# Altium footprint library Vowstar_IC_General.PcbLib: 139 footprints (part 5 of 9)
Each footprint in its own frame and in the unit in brackets; x right, y up, seen from the top. Pads: shape width x height; smd on the part's side, far side on the other; paste and mask are expansions set on the pad; w line width, h text height; cw(c..) or ccw(c..) is an arc to the next point about the centre after c.
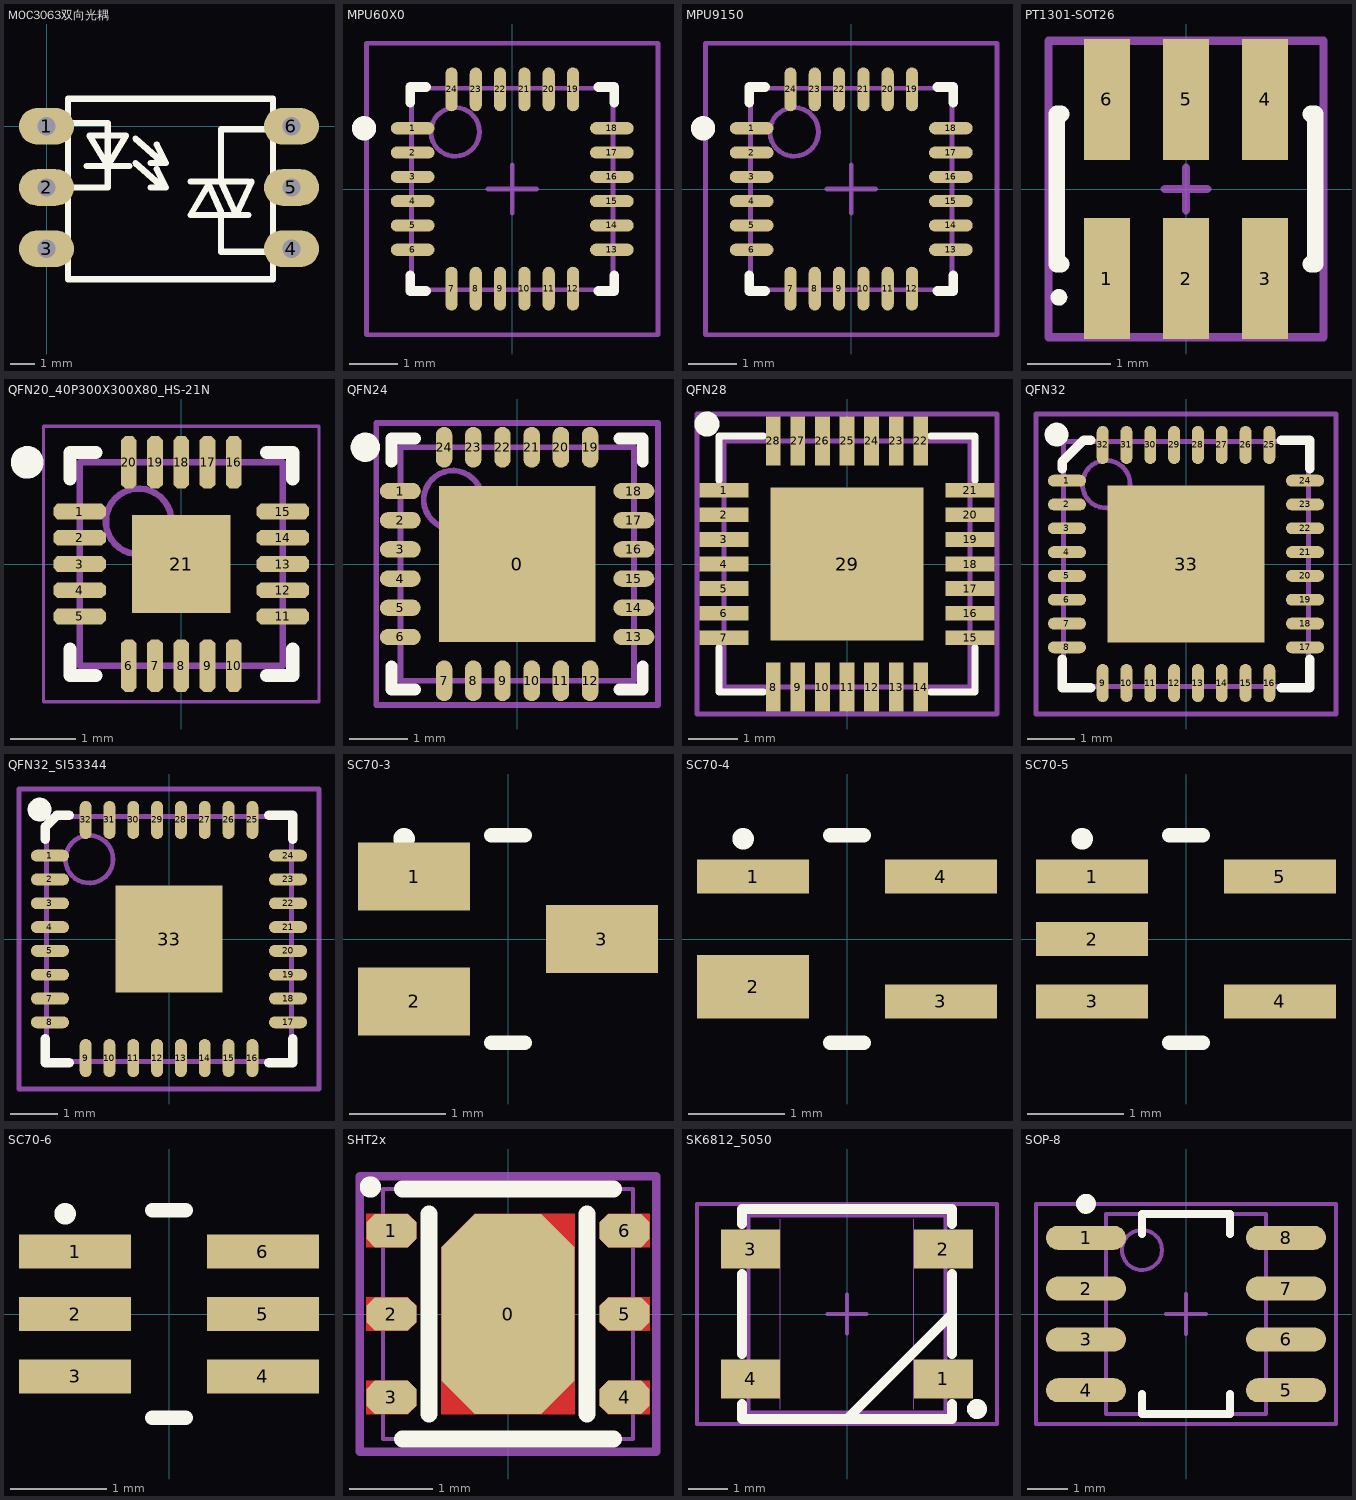
[diagram p4: the footprints below, top view; thin cyan lines are the x and y axes]

## MOC3063双向光耦 [mil] "MOC3063双向光耦"
pads (6):
  oval 90x60 hole 30: 1(0,0) 2(0,-100) 3(0,-200) 4(400,-200) 5(400,-100) 6(400,0)
Top Overlay:
  lines w10: 0,-100 100,-100 100,5 35,5 ; 65,-65 135,-65 ; 145,-60 185,-95 ; 145,-20 185,-55 ; 170,-100 195,-100 180,-70 ; 170,-60 195,-60 180,-30 ; 235,-90 330,-90 ; 285,-145 285,-205 370,-205 ; 285,-140 265,-95 235,-145 330,-145 ; 335,-90 310,-145 285,-90 285,-5 370,-5 ; 35,-250 35,45 370,45 370,-250 35,-250 ; 70,-15 100,-65 130,-15 70,-15

## MPU60X0 [mm] "24 Lead QFN (4x4x0.9) mm NiPdAu Lead-frame finish"
height 0.9
pads (24):
  oval 0.9x0.25 smd: 1(-2.05,1.25) 2(-2.05,0.75) 3(-2.05,0.25) 4(-2.05,-0.25) 5(-2.05,-0.75) 6(-2.05,-1.25) 13(2.05,-1.25) 14(2.05,-0.75) 15(2.05,-0.25) 16(2.05,0.25) 17(2.05,0.75) 18(2.05,1.25)
  oval 0.25x0.9 smd: 7(-1.25,-2.05) 8(-0.75,-2.05) 9(-0.25,-2.05) 10(0.25,-2.05) 11(0.75,-2.05) 12(1.25,-2.05) 19(1.25,2.05) 20(0.75,2.05) 21(0.25,2.05) 22(-0.25,2.05) 23(-0.75,2.05) 24(-1.25,2.05)
Top Overlay:
  circle w0.25: c-3.05,1.25 r0.125
  lines w0.2: -2.1,-1.775 -2.1,-2.1 -1.775,-2.1 ; -2.1,1.775 -2.1,2.1 -1.775,2.1 ; 1.775,-2.1 2.1,-2.1 2.1,-1.775 ; 1.775,2.1 2.1,2.1 2.1,1.775
Mechanical 13:
  circle w0.1: c-1.175,1.175 r0.5
  lines w0.1: -2.075,-2.075 -2.075,2.075 2.075,2.075 2.075,-2.075 -2.075,-2.075
Mechanical 15:
  lines w0.1: -0.5,0 0.5,0 ; 0,-0.5 0,0.5 ; -3,-3 -3,3 3,3 3,-3 -3,-3
3D body "User Library-QFN-24-4x4mm 0.5 Pitch.step": height 0.9, standoff 0, extent -2.002,-2.002 2.002,2.002

## MPU9150 [mm] "24 Lead QFN (4x4x0.9) mm NiPdAu Lead-frame finish"
height 0.9
pads (24):
  oval 0.9x0.25 smd: 1(-2.05,1.25) 2(-2.05,0.75) 3(-2.05,0.25) 4(-2.05,-0.25) 5(-2.05,-0.75) 6(-2.05,-1.25) 13(2.05,-1.25) 14(2.05,-0.75) 15(2.05,-0.25) 16(2.05,0.25) 17(2.05,0.75) 18(2.05,1.25)
  oval 0.25x0.9 smd: 7(-1.25,-2.05) 8(-0.75,-2.05) 9(-0.25,-2.05) 10(0.25,-2.05) 11(0.75,-2.05) 12(1.25,-2.05) 19(1.25,2.05) 20(0.75,2.05) 21(0.25,2.05) 22(-0.25,2.05) 23(-0.75,2.05) 24(-1.25,2.05)
Top Overlay:
  circle w0.25: c-3.05,1.25 r0.125
  lines w0.2: -2.1,-1.775 -2.1,-2.1 -1.775,-2.1 ; -2.1,1.775 -2.1,2.1 -1.775,2.1 ; 1.775,-2.1 2.1,-2.1 2.1,-1.775 ; 1.775,2.1 2.1,2.1 2.1,1.775
Mechanical 13:
  circle w0.1: c-1.175,1.175 r0.5
  lines w0.1: -2.075,-2.075 2.075,-2.075 2.075,2.075 -2.075,2.075 -2.075,-2.075
Mechanical 15:
  lines w0.1: -0.5,0 0.5,0 ; 0,-0.5 0,0.5 ; -3,-3 3,-3 3,3 -3,3 -3,-3
3D body "User Library-QFN-24-4x4mm 0.5 Pitch.step": height 0.9, standoff 0, extent -2.002,-2.002 2.002,2.002

## PT1301-SOT26 [mm] "PT1301-SOT26(SOT-23-6)"
height 1.45
pads (6):
  rect 0.55x1.45 smd: 1(-0.95,-1.075) 2(0,-1.075) 3(0.95,-1.075) 4(0.95,1.075) 5(0,1.075) 6(-0.95,1.075)
Top Overlay:
  circle w0.1: c-1.525,-1.3 r0.05
  lines w0.2: -1.5,-0.9 -1.55,-0.9 -1.55,0.9 -1.5,0.9 ; 1.5,-0.9 1.55,-0.9 1.55,0.9 1.5,0.9
Mechanical 15:
  lines w0.1: -0.254,0 0.254,0 ; 0,-0.254 0,0.254 ; -1.651,-1.778 -1.651,1.778 1.651,1.778 1.651,-1.778 -1.651,-1.778
3D body "User Library-SOT23-6.step": height 1.45, standoff 0, extent -1.448,-1.4 1.452,1.4

## QFN20_40P300X300X80_HS-21N [mm] "QFN, 20-Leads, Body 3.00x3.00mm, Pitch 0.40mm, Thermal Pad 1.65x1.65mm, IPC Medium Density"
height 0.8
pads (21):
  oct 0.8x0.24 smd: 1(-1.55,0.8) 2(-1.55,0.4) 3(-1.55,0) 4(-1.55,-0.4) 5(-1.55,-0.8) 11(1.55,-0.8) 12(1.55,-0.4) 13(1.55,0) 14(1.55,0.4) 15(1.55,0.8)
  oct 0.24x0.8 smd: 6(-0.8,-1.55) 7(-0.4,-1.55) 8(0,-1.55) 9(0.4,-1.55) 10(0.8,-1.55) 16(0.8,1.55) 17(0.4,1.55) 18(0,1.55) 19(-0.4,1.55) 20(-0.8,1.55)
  rect 1.5x1.5 smd: 21(0,0)
Top Overlay:
  circle w0.25: c-2.35,1.55 r0.125
  lines w0.2: -1.7,-1.3 -1.7,-1.7 -1.3,-1.7 ; -1.7,1.3 -1.7,1.7 -1.3,1.7 ; 1.3,-1.7 1.7,-1.7 1.7,-1.3 ; 1.3,1.7 1.7,1.7 1.7,1.3
Mechanical 13:
  circle w0.1: c-0.65,0.65 r0.5
  lines w0.1: -1.55,-1.55 1.55,-1.55 1.55,1.55 -1.55,1.55 -1.55,-1.55
Mechanical 15:
  lines w0.05: -2.1,-2.1 2.1,-2.1 2.1,2.1 -2.1,2.1 -2.1,-2.1
  lines w0.1: -0.5,0 0.5,0 ; 0,-0.5 0,0.5
3D body "QFN40P300X300X80_HS-21N.step": height 0.8, standoff 0, extent -1.56,-1.56 1.56,1.56

## QFN24 [mm] "QFN24, 0.5Pitch, 4.0x4.0mm"
height 1
pads (25):
  rect 2.68x2.68 smd mask+0.051: 0(0,0)
  oval 0.7x0.28 smd mask+0.051: 1(-2,1.25) 2(-2,0.75) 3(-2,0.25) 4(-2,-0.25) 5(-2,-0.75) 6(-2,-1.25) 13(2,-1.25) 14(2,-0.75) 15(2,-0.25) 16(2,0.25) 17(2,0.75) 18(2,1.25)
  oval 0.28x0.7 smd mask+0.051: 7(-1.25,-2) 8(-0.75,-2) 9(-0.25,-2) 10(0.25,-2) 11(0.75,-2) 12(1.25,-2) 19(1.25,2) 20(0.75,2) 21(0.25,2) 22(-0.25,2) 23(-0.75,2) 24(-1.25,2)
Top Overlay:
  circle w0.25: c-2.6,2 r0.125
  lines w0.2: -2.15,-1.75 -2.15,-2.15 -1.75,-2.15 ; -2.15,1.75 -2.15,2.15 -1.75,2.15 ; 1.75,-2.15 2.15,-2.15 2.15,-1.75 ; 1.75,2.15 2.15,2.15 2.15,1.75
Mechanical 13:
  circle w0.1: c-1.1,1.1 r0.5
  lines w0.1: -2,-2 2,-2 2,2 -2,2 -2,-2
Mechanical 15:
  lines w0.1: -2.413,-2.413 2.413,-2.413 2.413,2.413 -2.413,2.413 -2.413,-2.413
3D body "User Library-QFN-24-4x4mm 0.5 Pitch.step": height 0.9, standoff 0, extent -2.002,-2.002 2.002,2.002

## QFN28 [mm] "QFN28, 0.5Pitch, 5.0x5.0mm"
height 1
pads (29):
  rect 1x0.3 smd: 1(-2.5,1.5) 2(-2.5,1) 3(-2.5,0.5) 4(-2.5,0) 5(-2.5,-0.5) 6(-2.5,-1) 7(-2.5,-1.5) 15(2.5,-1.5) 16(2.5,-1) 17(2.5,-0.5) 18(2.5,0) 19(2.5,0.5) 20(2.5,1) 21(2.5,1.5)
  rect 0.3x1 smd: 8(-1.5,-2.5) 9(-1,-2.5) 10(-0.5,-2.5) 11(0,-2.5) 12(0.5,-2.5) 13(1,-2.5) 14(1.5,-2.5) 22(1.5,2.5) 23(1,2.5) 24(0.5,2.5) 25(0,2.5) 26(-0.5,2.5) 27(-1,2.5) 28(-1.5,2.5)
  rect 3.1x3.1 smd: 29(0,0)
Top Overlay:
  circle w0.254: c-2.844,2.844 r0.127
  lines w0.15: -2.6,-1.7 -2.6,-2.6 -1.7,-2.6 ; -2.6,1.7 -2.6,2.6 ; -2.591,2.6 -1.7,2.6 ; 1.7,-2.6 2.6,-2.6 2.6,-1.7 ; 1.7,2.6 2.6,2.6 2.6,1.7
Mechanical 13:
  lines w0.1: -2.5,-2.5 2.5,-2.5 2.5,2.5 -2.5,2.5 -2.5,-2.5
Mechanical 15:
  lines w0.1: -0.5,0 0.5,0 ; 0,-0.5 0,0.5 ; -3.048,-3.048 3.048,-3.048 3.048,3.048 -3.048,3.048 -3.048,-3.048
3D body "User Library-QFN-28-0_5.STEP": height 1, standoff 0, extent -2.5,-2.5 2.5,2.5

## QFN32 [mm] "32-Pin Quad Flat No-Lead 0.5 mm Pitch, IPC High Density"
height 0.8
pads (33):
  oval 0.8x0.25 smd: 1(-2.5,1.75) 2(-2.5,1.25) 3(-2.5,0.75) 4(-2.5,0.25) 5(-2.5,-0.25) 6(-2.5,-0.75) 7(-2.5,-1.25) 8(-2.5,-1.75) 17(2.5,-1.75) 18(2.5,-1.25) 19(2.5,-0.75) 20(2.5,-0.25) 21(2.5,0.25) 22(2.5,0.75) 23(2.5,1.25) 24(2.5,1.75)
  oval 0.25x0.8 smd: 9(-1.75,-2.5) 10(-1.25,-2.5) 11(-0.75,-2.5) 12(-0.25,-2.5) 13(0.25,-2.5) 14(0.75,-2.5) 15(1.25,-2.5) 16(1.75,-2.5) 25(1.75,2.5) 26(1.25,2.5) 27(0.75,2.5) 28(0.25,2.5) 29(-0.25,2.5) 30(-0.75,2.5) 31(-1.25,2.5) 32(-1.75,2.5)
  rect 3.3x3.3 smd paste-2.54: 33(0,0)
Top Overlay:
  circle w0.25: c-2.718,2.718 r0.125
  lines w0.2: -2.6,-2 -2.6,-2.6 -2,-2.6 ; -2.6,2 -2.6,2.15 -2.15,2.6 -2,2.6 ; 2,-2.6 2.6,-2.6 2.6,-2 ; 2,2.6 2.6,2.6 2.6,2
Top Paste:
  region: 1.5,0.15 0.15,0.15 0.15,1.5 1.5,1.5
  region: 0.15,-1.5 0.15,-0.15 1.5,-0.15 1.5,-1.5
  region: -1.5,-0.15 -0.15,-0.15 -0.15,-1.5 -1.5,-1.5
  region: -0.15,1.5 -0.15,0.15 -1.5,0.15 -1.5,1.5
Mechanical 13:
  circle w0.1: c-1.675,1.675 r0.5
  lines w0.1: -2.575,-2.575 2.575,-2.575 2.575,2.575 -2.575,2.575 -2.575,-2.575
Mechanical 15:
  lines w0.1: -0.5,0 0.5,0 ; 0,-0.5 0,0.5 ; -3.15,-3.15 3.15,-3.15 3.15,3.15 -3.15,3.15 -3.15,-3.15
3D body "User Library-QFN-32-5x5mm-WithPad.step": height 0.8, standoff 0, extent -2.51,-2.51 2.51,2.51

## QFN32_SI53344 [mm] "32-Pin Quad Flat No-Lead 0.5 mm Pitch, IPC High Density"
height 0.8
pads (33):
  oval 0.8x0.25 smd: 1(-2.5,1.75) 2(-2.5,1.25) 3(-2.5,0.75) 4(-2.5,0.25) 5(-2.5,-0.25) 6(-2.5,-0.75) 7(-2.5,-1.25) 8(-2.5,-1.75) 17(2.5,-1.75) 18(2.5,-1.25) 19(2.5,-0.75) 20(2.5,-0.25) 21(2.5,0.25) 22(2.5,0.75) 23(2.5,1.25) 24(2.5,1.75)
  oval 0.25x0.8 smd: 9(-1.75,-2.5) 10(-1.25,-2.5) 11(-0.75,-2.5) 12(-0.25,-2.5) 13(0.25,-2.5) 14(0.75,-2.5) 15(1.25,-2.5) 16(1.75,-2.5) 25(1.75,2.5) 26(1.25,2.5) 27(0.75,2.5) 28(0.25,2.5) 29(-0.25,2.5) 30(-0.75,2.5) 31(-1.25,2.5) 32(-1.75,2.5)
  rect 2.25x2.25 smd paste-2.54: 33(0,0)
Top Overlay:
  circle w0.25: c-2.718,2.718 r0.125
  lines w0.2: -2.6,-2.1 -2.6,-2.6 -2.1,-2.6 ; -2.6,2.1 -2.6,2.353 -2.353,2.6 -2.1,2.6 ; 2.1,-2.6 2.6,-2.6 2.6,-2.1 ; 2.1,2.6 2.6,2.6 2.6,2.1
Top Paste:
  region: -0.15,1.016 -0.15,0.15 -1.016,0.15 -1.016,1.016
  region: -1.016,-0.15 -0.15,-0.15 -0.15,-1.016 -1.016,-1.016
  region: 0.15,-1.016 0.15,-0.15 1.016,-0.15 1.016,-1.016
  region: 1.016,0.15 0.15,0.15 0.15,1.016 1.016,1.016
Mechanical 13:
  circle w0.1: c-1.675,1.675 r0.5
  lines w0.1: -2.575,-2.575 -2.575,2.575 2.575,2.575 2.575,-2.575 -2.575,-2.575
Mechanical 15:
  lines w0.1: -0.5,0 0.5,0 ; 0,-0.5 0,0.5 ; -3.15,-3.15 -3.15,3.15 3.15,3.15 3.15,-3.15 -3.15,-3.15
3D body "User Library-QFN-32-5x5mm-WithPad.step": height 0.8, standoff 0, extent -2.51,-2.51 2.51,2.51

## SC70-3 [mil] "SC70/SOT-323 (DCK) Package. 3-Lead Plastic SC70."
height 39.37
pads (3):
  rect 46x28 smd: 1(-38.5,25.59) 2(-38.5,-25.59) 3(38.5,0)
Top Overlay:
  circle w6: c-42.59,41.09 r1.41
  lines w6: -6.93,-42.5 6.93,-42.5 ; -6.93,42.5 6.93,42.5
3D body "User Library-SC70-3.step": height 39.37, standoff 0, extent -45.27,-41.35 45.29,41.33

## SC70-4 [mil] "SC70/SOT-323 (DCK) Package. 4-Lead Plastic SC70."
height 39.37
pads (4):
  rect 46x14 smd: 1(-38.5,25.59) 3(38.5,-25.59) 4(38.5,25.59)
  rect 46x26 smd: 2(-38.5,-19.59)
Top Overlay:
  circle w6: c-42.59,41.09 r1.41
  lines w6: -6.93,-42.5 6.93,-42.5 ; -6.93,42.5 6.93,42.5
3D body "User Library-SC70-4.step": height 42.98, standoff -0.32, extent -43.3,-39.38 43.31,39.36

## SC70-5 [mil] "SC70/SOT-323 (DCK) Package. 5-Lead Plastic SC70."
height 39.37
pads (5):
  rect 46x14 smd: 1(-38.5,25.59) 2(-38.5,0) 3(-38.5,-25.59) 4(38.5,-25.59) 5(38.5,25.59)
Top Overlay:
  circle w6: c-42.59,41.09 r1.41
  lines w6: -6.93,-42.5 6.93,-42.5 ; -6.93,42.5 6.93,42.5
3D body "User Library-SC70-5.step": height 37.4, standoff 0, extent -41.34,-39.37 41.34,39.37

## SC70-6 [mil] "SC70/SOT-323 (DCK) Package. 6-Lead Plastic SC70."
height 39.37
pads (6):
  rect 46x14 smd: 1(-38.5,25.59) 2(-38.5,0) 3(-38.5,-25.59) 4(38.5,-25.59) 5(38.5,0) 6(38.5,25.59)
Top Overlay:
  circle w6: c-42.59,41.09 r1.41
  lines w6: -6.93,-42.5 6.93,-42.5 ; -6.93,42.5 6.93,42.5
3D body "User Library-SC70-6.step": height 36.42, standoff -0.98, extent -41.33,-39.37 41.34,39.37

## SHT2x [mm] "SHT2x, The outer dotted line represents the  outer dime  nsion of the DFN package"
height 1.1
pads (7):
  oct 1.6x2.4 smd paste-1 mask-1: 0(0,0)
  oct 0.6x0.4 smd paste+0 mask+0.102: 1(-1.4,1) 2(-1.4,0) 3(-1.4,-1) 4(1.4,-1) 5(1.4,0) 6(1.4,1)
Top Layer:
  region: -1.7,1.2 -1.2,1.2 -1.1,1.1 -1.1,0.9 -1.2,0.8 -1.7,0.8
  region: -1.7,0.2 -1.2,0.2 -1.1,0.1 -1.1,-0.1 -1.2,-0.2 -1.7,-0.2
  region: -1.7,-0.8 -1.2,-0.8 -1.1,-0.9 -1.1,-1.1 -1.2,-1.2 -1.7,-1.2
  region: 1.7,-0.2 1.2,-0.2 1.1,-0.1 1.1,0.1 1.2,0.2 1.7,0.2
  region: 1.7,-1.2 1.2,-1.2 1.1,-1.1 1.1,-0.9 1.2,-0.8 1.7,-0.8
  region: 1.7,0.8 1.2,0.8 1.1,0.9 1.1,1.1 1.2,1.2 1.7,1.2
  region: -0.8,0.8 -0.4,1.2 0.8,1.2 0.8,-1.2 -0.8,-1.2
Top Overlay:
  circle w0.152: c-1.651,1.524 r0.051
  lines w0.2: -1.27,-1.5 1.27,-1.5 ; -1.27,1.5 1.27,1.5
  lines w0.203: -0.95,-1.2 -0.95,1.2 ; 0.95,-1.2 0.95,1.2
Top Paste:
  region: 0.8,-1.2 0.4,-1.2 0.4,-1 0.8,-1
  region: 0.2,-1.2 -0.2,-1.2 -0.2,-1 0.2,-1
  region: -0.4,-1.2 -0.8,-1.2 -0.8,-1 -0.4,-1
  region: 0.8,-0.8 0.4,-0.8 0.4,-0.4 0.8,-0.4
  region: 0.2,-0.8 -0.2,-0.8 -0.2,-0.4 0.2,-0.4
  region: -0.4,-0.8 -0.8,-0.8 -0.8,-0.4 -0.4,-0.4
  region: -0.4,-0.2 -0.8,-0.2 -0.8,0.2 -0.4,0.2
  region: 0.2,-0.2 -0.2,-0.2 -0.2,0.2 0.2,0.2
  region: 0.8,-0.2 0.4,-0.2 0.4,0.2 0.8,0.2
  region: 1.7,0.8 1.2,0.8 1.1,0.9 1.1,1.1 1.2,1.2 1.7,1.2
  region: 1.7,-0.2 1.2,-0.2 1.1,-0.1 1.1,0.1 1.2,0.2 1.7,0.2
  region: -1.7,0.2 -1.2,0.2 -1.1,0.1 -1.1,-0.1 -1.2,-0.2 -1.7,-0.2
  region: -1.7,-0.8 -1.2,-0.8 -1.1,-0.9 -1.1,-1.1 -1.2,-1.2 -1.7,-1.2
  region: 1.7,-1.2 1.2,-1.2 1.1,-1.1 1.1,-0.9 1.2,-0.8 1.7,-0.8
  region: -1.7,1.2 -1.2,1.2 -1.1,1.1 -1.1,0.9 -1.2,0.8 -1.7,0.8
  region: 0.8,0.4 0.4,0.4 0.4,0.8 0.8,0.8
  region: 0.2,0.4 -0.2,0.4 -0.2,0.8 0.2,0.8
  region: -0.4,0.4 -0.8,0.4 -0.8,0.8 -0.4,0.8
  region: 0.8,1 0.4,1 0.4,1.2 0.8,1.2
  region: 0.2,1 -0.2,1 -0.2,1.2 0.2,1.2
  region: -0.4,1 -0.6,1 -0.4,1.2
Top Solder:
  region: -1.8,1.3 -1.15,1.3 -1,1.15 -1,0.85 -1.15,0.7 -1.8,0.7
  region: -1.8,0.3 -1.15,0.3 -1,0.15 -1,-0.15 -1.15,-0.3 -1.8,-0.3
  region: -1.8,-0.7 -1.15,-0.7 -1,-0.85 -1,-1.15 -1.15,-1.3 -1.8,-1.3
  region: 1.8,-1.3 1.15,-1.3 1,-1.15 1,-0.85 1.15,-0.7 1.8,-0.7
  region: 1.8,-0.3 1.15,-0.3 1,-0.15 1,0.15 1.15,0.3 1.8,0.3
  region: 1.8,0.7 1.15,0.7 1,0.85 1,1.15 1.15,1.3 1.8,1.3
  region: -0.9,0.85 -0.45,1.3 0.9,1.3 0.9,-1.3 -0.9,-1.3
Mechanical 13:
  lines w0.051: -1.5,-1.5 1.5,-1.5 1.5,1.5 -1.5,1.5 -1.5,-1.5
Mechanical 15:
  lines w0.1: -0.254,0 0.254,0 ; 0,-0.254 0,0.254 ; -1.778,-1.651 -1.778,1.651 1.778,1.651 1.778,-1.651 -1.778,-1.651
3D body "User Library-Sensor_SHT21.step": height 1.1, standoff -0.02, extent -1.499,-1.5 1.521,1.5

## SK6812_5050 [mm] "SMT LED"
height 1.3
pads (4):
  rect 1.5x1 smd: 1(2.45,-1.65) 2(2.45,1.65) 3(-2.45,1.65) 4(-2.45,-1.65)
Top Overlay:
  circle w0.254: c3.302,-2.413 r0.127
  lines w0.254: -2.667,-2.286 -2.667,-2.667 2.667,-2.667 2.667,-2.286 ; -2.667,-1.016 -2.667,1.016 ; -2.667,2.286 -2.667,2.667 2.667,2.667 2.667,2.286 ; 0,-2.667 2.667,0 ; 2.667,-1.016 2.667,1.016
Mechanical 13:
  lines w0.02: -1.7,-2.413 -1.7,2.413 ; 1.7,-2.413 1.7,2.413
  lines w0.1: -2.5,-2.5 -2.5,2.5 2.5,2.5 2.5,-2.5 -2.5,-2.5
Mechanical 15:
  lines w0.1: -0.5,0 0.5,0 ; 0,-0.5 0,0.5 ; -3.81,-2.794 -3.81,2.794 3.81,2.794 3.81,-2.794 -3.81,-2.794
3D body "User Library-WS2812B.step": height 1.7, standoff 0, extent -2.733,-2.54 2.667,2.46

## SOP-8 [mm] "8-Pin Small Outline Integrated Circuit 1.27 mm Pitch, IPC Low Density"
height 1.75
pads (8):
  oval 2x0.6 smd: 1(-2.5,1.905) 2(-2.5,0.635) 3(-2.5,-0.635) 4(-2.5,-1.905) 5(2.5,-1.905) 6(2.5,-0.635) 7(2.5,0.635) 8(2.5,1.905)
Top Overlay:
  circle w0.25: c-2.5,2.755 r0.125
  lines w0.2: -1.1,-2 -1.1,-2.5 1.1,-2.5 1.1,-2 ; -1.1,2 -1.1,2.5 1.1,2.5 1.1,2
Mechanical 13:
  circle w0.1: c-1.1,1.6 r0.5
  lines w0.1: -2,-2.5 2,-2.5 2,2.5 -2,2.5 -2,-2.5
Mechanical 15:
  lines w0.1: -0.5,0 0.5,0 ; 0,-0.5 0,0.5 ; -3.75,-2.75 3.75,-2.75 3.75,2.75 -3.75,2.75 -3.75,-2.75
3D body "User Library-SOP-8.step": height 1.45, standoff 0, extent -2.921,-2.451 2.857,2.451